# Altium footprint library Components.PcbLib: 6 footprints
Each footprint in its own frame and in the unit in brackets; x right, y up, seen from the top. Pads: shape width x height; smd on the part's side, far side on the other; paste and mask are expansions set on the pad; w line width, h text height; cw(c..) or ccw(c..) is an arc to the next point about the centre after c.
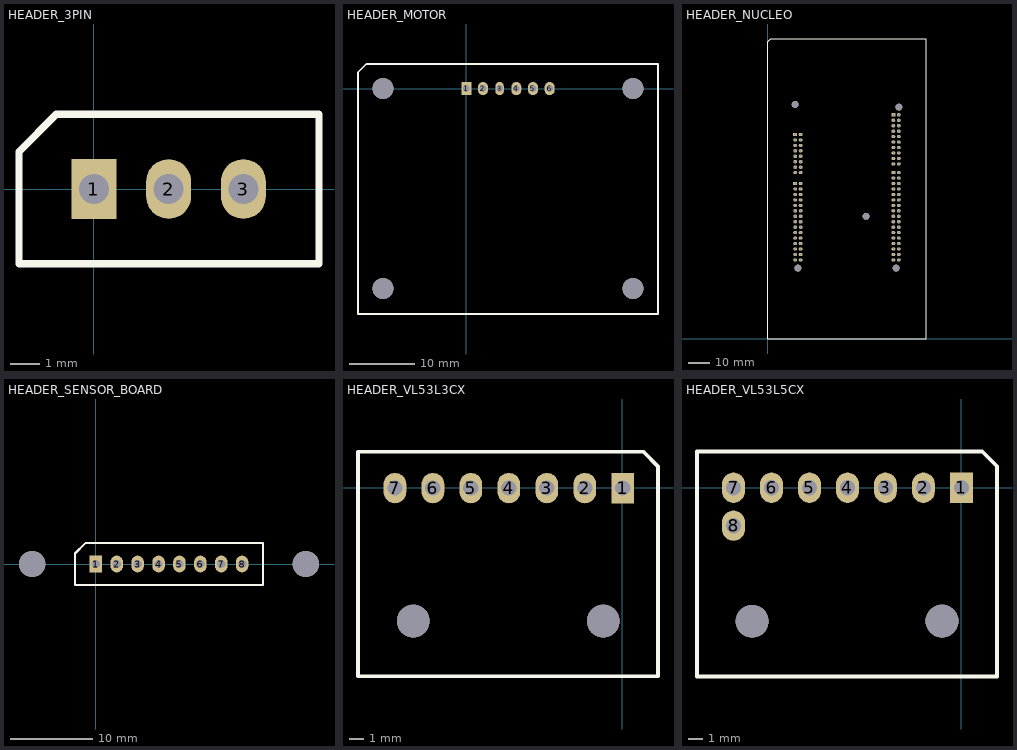
[diagram p0: the footprints below, top view; thin cyan lines are the x and y axes]

## HEADER_3PIN [mil]
pads (3):
  rect 60x80 hole 40.16: 1(0,0)
  oval 60x80 hole 40.16: 2(100,0) 3(200,0)
Top Overlay:
  lines w10: -100,-100 -100,50 -50,100 301,100 301,-100 -100,-100

## HEADER_MOTOR [mm]
pads (10):
  rect 1.524x2.032 hole 1.02: 1(0,0)
  oval 1.524x2.032 hole 1.02: 2(2.54,0) 4(7.62,0) 5(10.16,0) 6(12.7,0)
  oval 1.27x2.032 hole 1.02: 3(5.08,0)
  round 3.2 hole 3.2: ""(-12.7,-30.48) ""(-12.7,0) ""(25.4,-30.48) ""(25.4,0)
Top Overlay:
  lines w0.254: -16.502,-34.357 -16.502,2.473 -15.232,3.743 29.218,3.743 29.218,-34.357 -16.502,-34.357
3D body "MAKER-DRIVE.STEP": height 16.93, standoff 3.43, extent -15.232,-33.087 27.948,2.473
3D body: height 8.64, standoff 0, extent 11.411,-1.255 13.951,1.285
3D body: height 8.64, standoff 0, extent 8.871,-1.255 11.411,1.285
3D body: height 8.64, standoff 0, extent 6.331,-1.255 8.871,1.285
3D body: height 8.64, standoff 0, extent 3.791,-1.255 6.331,1.285
3D body: height 8.64, standoff 0, extent 1.251,-1.255 3.791,1.285
3D body: height 8.64, standoff 0, extent -1.289,-1.255 1.251,1.285

## HEADER_NUCLEO [mm] "Header for nucleo board"
pads (105):
  rect 1.8x1.5 hole 1.02: 1(12.7,95.25) 17(12.7,72.39) 47(58.42,104.394) 67(58.42,77.47)
  oval 1.8x1.5 hole 1.02: 2(15.24,95.25) 3(12.7,92.71) 4(15.24,92.71) 5(12.7,90.17) 6(15.24,90.17) 7(12.7,87.63) 8(15.24,87.63) 9(12.7,85.09) 10(15.24,85.09) 11(12.7,82.55) 12(15.24,82.55) 13(12.7,80.01) 14(15.24,80.01) 15(12.7,77.47) 16(15.24,77.47) 18(15.24,72.39) 19(12.7,69.85) 20(15.24,69.85) 21(12.7,67.31) 22(15.24,67.31) 23(12.7,64.77) 24(15.24,64.77) 25(12.7,62.23) 26(15.24,62.23) 27(12.7,59.69) 28(15.24,59.69) 29(12.7,57.15) 30(15.24,57.15) 31(12.7,54.61) 32(15.24,54.61) 33(12.7,52.07) 34(15.24,52.07) 35(12.7,49.53) 36(15.24,49.53) 37(12.7,46.99) 38(15.24,46.99) 39(12.7,44.45) 40(15.24,44.45) 41(12.7,41.91) 42(15.24,41.91) 43(12.7,39.37) 44(15.24,39.37) 45(12.7,36.83) 46(15.24,36.83) 48(60.96,104.394) 49(58.42,101.854) 50(60.96,101.854) 51(58.42,99.314) 52(60.96,99.314) 53(58.42,96.774) 54(60.96,96.774) 55(58.42,94.234) 56(60.96,94.234) 57(58.42,91.694) 58(60.96,91.694) 59(58.42,89.154) 60(60.96,89.154) 61(58.42,86.614) 62(60.96,86.614) 63(58.42,84.074) 64(60.96,84.074) 65(58.42,81.534) 66(60.96,81.534) 68(60.96,77.47) 69(58.42,74.93) 70(60.96,74.93) 71(58.42,72.39) 72(60.96,72.39) 73(58.42,69.85) 74(60.96,69.85) 75(58.42,67.31) 76(60.96,67.31) 77(58.42,64.77) 78(60.96,64.77) 79(58.42,62.23) 80(60.96,62.23) 81(58.42,59.69) 82(60.96,59.69) 83(58.42,57.15) 84(60.96,57.15) 85(58.42,54.61) 86(60.96,54.61) 87(58.42,52.07) 88(60.96,52.07) 89(58.42,49.53) 90(58.42,46.99) 90(60.96,49.53) 92(60.96,46.99) 93(58.42,44.45) 94(60.96,44.45) 95(58.42,41.91) 96(60.96,41.91) 97(58.42,39.37) 98(60.96,39.37) 99(58.42,36.83) 100(60.96,36.83)
  round 3.2 hole 3.2 unplated: ""(12.7,109.22) ""(13.97,33.02) ""(45.72,57.15) ""(59.69,33.02) ""(60.96,107.95)
Top Overlay:
  lines w0.254: 0,0 0,138.43 1.27,139.7 73.66,139.7 73.66,1.27 73.66,0 0,0
3D body: height 8.64, standoff 0, extent 57.15,40.638 59.69,43.178
3D body: height 2.54, standoff -10, extent 58.071,41.561 58.769,42.259
3D body: height 8.64, standoff 0, extent 59.69,40.638 62.23,43.178
3D body: height 2.54, standoff -10, extent 60.611,41.561 61.309,42.259
3D body: height 2.54, standoff -10, extent 60.611,51.721 61.309,52.419
3D body: height 8.64, standoff 0, extent 59.69,50.798 62.23,53.338
3D body: height 2.54, standoff -10, extent 58.071,51.721 58.769,52.419
3D body: height 8.64, standoff 0, extent 57.15,50.798 59.69,53.338
3D body: height 8.64, standoff 0, extent 57.15,45.718 59.69,48.258
3D body: height 2.54, standoff -10, extent 58.071,46.641 58.769,47.339
3D body: height 8.64, standoff 0, extent 59.69,45.718 62.23,48.258
3D body: height 2.54, standoff -10, extent 60.611,46.641 61.309,47.339
3D body: height 8.64, standoff 0, extent 59.69,48.258 62.23,50.798
3D body: height 2.54, standoff -10, extent 60.611,49.181 61.309,49.879
3D body: height 8.64, standoff 0, extent 57.15,48.258 59.69,50.798
3D body: height 2.54, standoff -10, extent 58.071,49.181 58.769,49.879
3D body: height 2.54, standoff -10, extent 60.611,44.101 61.309,44.799
3D body: height 8.64, standoff 0, extent 59.69,43.178 62.23,45.718
3D body: height 2.54, standoff -10, extent 58.071,44.101 58.769,44.799
3D body: height 8.64, standoff 0, extent 57.15,43.178 59.69,45.718
3D body: height 8.64, standoff 0, extent 57.15,55.878 59.69,58.418
3D body: height 2.54, standoff -10, extent 58.071,56.801 58.769,57.499
3D body: height 8.64, standoff 0, extent 59.69,55.878 62.23,58.418
3D body: height 2.54, standoff -10, extent 60.611,56.801 61.309,57.499
3D body: height 2.54, standoff -10, extent 58.071,61.881 58.769,62.579
3D body: height 8.64, standoff 0, extent 57.15,60.958 59.69,63.498
3D body: height 2.54, standoff -10, extent 60.611,61.881 61.309,62.579
3D body: height 8.64, standoff 0, extent 59.69,60.958 62.23,63.498
3D body: height 2.54, standoff -10, extent 60.611,59.341 61.309,60.039
3D body: height 8.64, standoff 0, extent 59.69,58.418 62.23,60.958
3D body: height 2.54, standoff -10, extent 58.071,59.341 58.769,60.039
3D body: height 8.64, standoff 0, extent 57.15,58.418 59.69,60.958
3D body: height 8.64, standoff 0, extent 57.15,63.498 59.69,66.038
3D body: height 2.54, standoff -10, extent 58.071,64.421 58.769,65.119
3D body: height 8.64, standoff 0, extent 59.69,63.498 62.23,66.038
3D body: height 2.54, standoff -10, extent 60.611,64.421 61.309,65.119
3D body: height 8.64, standoff 0, extent 59.69,66.038 62.23,68.578
3D body: height 2.54, standoff -10, extent 60.611,66.961 61.309,67.659
3D body: height 8.64, standoff 0, extent 57.15,66.038 59.69,68.578
3D body: height 2.54, standoff -10, extent 58.071,66.961 58.769,67.659
3D body: height 8.64, standoff 0, extent 57.15,68.578 59.69,71.118
3D body: height 2.54, standoff -10, extent 58.071,69.501 58.769,70.199
3D body: height 8.64, standoff 0, extent 59.69,68.578 62.23,71.118
3D body: height 2.54, standoff -10, extent 60.611,69.501 61.309,70.199
3D body: height 8.64, standoff 0, extent 57.15,71.118 59.69,73.658
3D body: height 2.54, standoff -10, extent 58.071,72.041 58.769,72.739
3D body: height 8.64, standoff 0, extent 59.69,71.118 62.23,73.658
3D body: height 2.54, standoff -10, extent 60.611,72.041 61.309,72.739
3D body: height 8.64, standoff 0, extent 57.15,73.658 59.69,76.198
3D body: height 2.54, standoff -10, extent 58.071,74.581 58.769,75.279
3D body: height 8.64, standoff 0, extent 59.69,73.658 62.23,76.198
3D body: height 2.54, standoff -10, extent 60.611,74.581 61.309,75.279
3D body: height 8.64, standoff 0, extent 59.69,76.198 62.23,78.738
3D body: height 2.54, standoff -10, extent 60.611,77.121 61.309,77.819
3D body: height 8.64, standoff 0, extent 57.15,76.198 59.69,78.738
3D body: height 2.54, standoff -10, extent 58.071,77.121 58.769,77.819
3D body: height 2.54, standoff -10, extent 60.611,54.261 61.309,54.959
3D body: height 8.64, standoff 0, extent 59.69,53.338 62.23,55.878
3D body: height 2.54, standoff -10, extent 58.071,54.261 58.769,54.959
3D body: height 8.64, standoff 0, extent 57.15,53.338 59.69,55.878
3D body: height 8.64, standoff 0, extent 57.15,38.098 59.69,40.638
3D body: height 2.54, standoff -10, extent 58.071,39.021 58.769,39.719
3D body: height 8.64, standoff 0, extent 59.69,38.098 62.23,40.638
3D body: height 2.54, standoff -10, extent 60.611,39.021 61.309,39.719
3D body: height 2.54, standoff -10, extent 60.611,36.481 61.309,37.179
3D body: height 8.64, standoff 0, extent 59.69,35.558 62.23,38.098
3D body: height 2.54, standoff -10, extent 58.071,36.481 58.769,37.179
3D body: height 8.64, standoff 0, extent 57.15,35.558 59.69,38.098
3D body: height 8.64, standoff 0, extent 57.15,80.262 59.69,82.802
3D body: height 2.54, standoff -10, extent 58.071,81.185 58.769,81.883
3D body: height 8.64, standoff 0, extent 59.69,80.262 62.23,82.802
3D body: height 2.54, standoff -10, extent 60.611,81.185 61.309,81.883
3D body: height 2.54, standoff -10, extent 58.071,104.045 58.769,104.743
3D body: height 8.64, standoff 0, extent 57.15,103.122 59.69,105.662
3D body: height 2.54, standoff -10, extent 60.611,104.045 61.309,104.743
3D body: height 8.64, standoff 0, extent 59.69,103.122 62.23,105.662
3D body: height 2.54, standoff -10, extent 60.611,101.505 61.309,102.203
3D body: height 8.64, standoff 0, extent 59.69,100.582 62.23,103.122
3D body: height 2.54, standoff -10, extent 58.071,101.505 58.769,102.203
3D body: height 8.64, standoff 0, extent 57.15,100.582 59.69,103.122
3D body: height 2.54, standoff -10, extent 60.611,98.965 61.309,99.663
3D body: height 8.64, standoff 0, extent 59.69,98.042 62.23,100.582
3D body: height 2.54, standoff -10, extent 58.071,98.965 58.769,99.663
3D body: height 8.64, standoff 0, extent 57.15,98.042 59.69,100.582
3D body: height 2.54, standoff -10, extent 60.611,96.425 61.309,97.123
3D body: height 8.64, standoff 0, extent 59.69,95.502 62.23,98.042
3D body: height 2.54, standoff -10, extent 58.071,96.425 58.769,97.123
3D body: height 8.64, standoff 0, extent 57.15,95.502 59.69,98.042
3D body: height 2.54, standoff -10, extent 58.071,93.885 58.769,94.583
3D body: height 8.64, standoff 0, extent 57.15,92.962 59.69,95.502
3D body: height 2.54, standoff -10, extent 60.611,93.885 61.309,94.583
3D body: height 8.64, standoff 0, extent 59.69,92.962 62.23,95.502
3D body: height 2.54, standoff -10, extent 60.611,91.345 61.309,92.043
3D body: height 8.64, standoff 0, extent 59.69,90.422 62.23,92.962
3D body: height 2.54, standoff -10, extent 58.071,91.345 58.769,92.043
3D body: height 8.64, standoff 0, extent 57.15,90.422 59.69,92.962
3D body: height 8.64, standoff 0, extent 57.15,85.342 59.69,87.882
3D body: height 2.54, standoff -10, extent 58.071,86.265 58.769,86.963
3D body: height 8.64, standoff 0, extent 59.69,85.342 62.23,87.882
3D body: height 2.54, standoff -10, extent 60.611,86.265 61.309,86.963
3D body: height 8.64, standoff 0, extent 59.69,87.882 62.23,90.422
3D body: height 2.54, standoff -10, extent 60.611,88.805 61.309,89.503
3D body: height 8.64, standoff 0, extent 57.15,87.882 59.69,90.422
3D body: height 2.54, standoff -10, extent 58.071,88.805 58.769,89.503
3D body: height 2.54, standoff -10, extent 60.611,83.725 61.309,84.423
3D body: height 8.64, standoff 0, extent 59.69,82.802 62.23,85.342
3D body: height 2.54, standoff -10, extent 58.071,83.725 58.769,84.423
3D body: height 8.64, standoff 0, extent 57.15,82.802 59.69,85.342
3D body: height 8.64, standoff 0, extent 11.43,35.558 13.97,38.098
3D body: height 2.54, standoff -10, extent 12.351,36.481 13.049,37.179
3D body: height 8.64, standoff 0, extent 13.97,35.558 16.51,38.098
3D body: height 2.54, standoff -10, extent 14.891,36.481 15.589,37.179
3D body: height 2.54, standoff -10, extent 14.891,46.641 15.589,47.339
3D body: height 8.64, standoff 0, extent 13.97,45.718 16.51,48.258
3D body: height 2.54, standoff -10, extent 12.351,46.641 13.049,47.339
3D body: height 8.64, standoff 0, extent 11.43,45.718 13.97,48.258
3D body: height 8.64, standoff 0, extent 11.43,40.638 13.97,43.178
3D body: height 2.54, standoff -10, extent 12.351,41.561 13.049,42.259
3D body: height 8.64, standoff 0, extent 13.97,40.638 16.51,43.178
3D body: height 2.54, standoff -10, extent 14.891,41.561 15.589,42.259
3D body: height 8.64, standoff 0, extent 13.97,43.178 16.51,45.718
3D body: height 2.54, standoff -10, extent 14.891,44.101 15.589,44.799
3D body: height 8.64, standoff 0, extent 11.43,43.178 13.97,45.718
3D body: height 2.54, standoff -10, extent 12.351,44.101 13.049,44.799
3D body: height 2.54, standoff -10, extent 14.891,39.021 15.589,39.719
3D body: height 8.64, standoff 0, extent 13.97,38.098 16.51,40.638
3D body: height 2.54, standoff -10, extent 12.351,39.021 13.049,39.719
3D body: height 8.64, standoff 0, extent 11.43,38.098 13.97,40.638
3D body: height 8.64, standoff 0, extent 11.43,50.798 13.97,53.338
3D body: height 2.54, standoff -10, extent 12.351,51.721 13.049,52.419
3D body: height 8.64, standoff 0, extent 13.97,50.798 16.51,53.338
3D body: height 2.54, standoff -10, extent 14.891,51.721 15.589,52.419
3D body: height 2.54, standoff -10, extent 12.351,56.801 13.049,57.499
3D body: height 8.64, standoff 0, extent 11.43,55.878 13.97,58.418
3D body: height 2.54, standoff -10, extent 14.891,56.801 15.589,57.499
3D body: height 8.64, standoff 0, extent 13.97,55.878 16.51,58.418
3D body: height 2.54, standoff -10, extent 14.891,54.261 15.589,54.959
3D body: height 8.64, standoff 0, extent 13.97,53.338 16.51,55.878
3D body: height 2.54, standoff -10, extent 12.351,54.261 13.049,54.959
3D body: height 8.64, standoff 0, extent 11.43,53.338 13.97,55.878
3D body: height 8.64, standoff 0, extent 11.43,58.418 13.97,60.958
3D body: height 2.54, standoff -10, extent 12.351,59.341 13.049,60.039
3D body: height 8.64, standoff 0, extent 13.97,58.418 16.51,60.958
3D body: height 2.54, standoff -10, extent 14.891,59.341 15.589,60.039
3D body: height 8.64, standoff 0, extent 13.97,60.958 16.51,63.498
3D body: height 2.54, standoff -10, extent 14.891,61.881 15.589,62.579
3D body: height 8.64, standoff 0, extent 11.43,60.958 13.97,63.498
3D body: height 2.54, standoff -10, extent 12.351,61.881 13.049,62.579
3D body: height 8.64, standoff 0, extent 11.43,63.498 13.97,66.038
3D body: height 2.54, standoff -10, extent 12.351,64.421 13.049,65.119
3D body: height 8.64, standoff 0, extent 13.97,63.498 16.51,66.038
3D body: height 2.54, standoff -10, extent 14.891,64.421 15.589,65.119
3D body: height 8.64, standoff 0, extent 11.43,66.038 13.97,68.578
3D body: height 2.54, standoff -10, extent 12.351,66.961 13.049,67.659
3D body: height 8.64, standoff 0, extent 13.97,66.038 16.51,68.578
3D body: height 2.54, standoff -10, extent 14.891,66.961 15.589,67.659
3D body: height 8.64, standoff 0, extent 11.43,68.578 13.97,71.118
3D body: height 2.54, standoff -10, extent 12.351,69.501 13.049,70.199
3D body: height 8.64, standoff 0, extent 13.97,68.578 16.51,71.118
3D body: height 2.54, standoff -10, extent 14.891,69.501 15.589,70.199
3D body: height 8.64, standoff 0, extent 13.97,71.118 16.51,73.658
3D body: height 2.54, standoff -10, extent 14.891,72.041 15.589,72.739
3D body: height 8.64, standoff 0, extent 11.43,71.118 13.97,73.658
3D body: height 2.54, standoff -10, extent 12.351,72.041 13.049,72.739
3D body: height 2.54, standoff -10, extent 14.891,49.181 15.589,49.879
3D body: height 8.64, standoff 0, extent 13.97,48.258 16.51,50.798
3D body: height 2.54, standoff -10, extent 12.351,49.181 13.049,49.879
3D body: height 8.64, standoff 0, extent 11.43,48.258 13.97,50.798
3D body: height 2.54, standoff -10, extent 12.351,94.901 13.049,95.599
3D body: height 8.64, standoff 0, extent 11.43,93.978 13.97,96.518
3D body: height 2.54, standoff -10, extent 14.891,94.901 15.589,95.599
3D body: height 8.64, standoff 0, extent 13.97,93.978 16.51,96.518
3D body: height 2.54, standoff -10, extent 14.891,92.361 15.589,93.059
3D body: height 8.64, standoff 0, extent 13.97,91.438 16.51,93.978
3D body: height 2.54, standoff -10, extent 12.351,92.361 13.049,93.059
3D body: height 8.64, standoff 0, extent 11.43,91.438 13.97,93.978
3D body: height 2.54, standoff -10, extent 14.891,89.821 15.589,90.519
3D body: height 8.64, standoff 0, extent 13.97,88.898 16.51,91.438
3D body: height 2.54, standoff -10, extent 12.351,89.821 13.049,90.519
3D body: height 8.64, standoff 0, extent 11.43,88.898 13.97,91.438
3D body: height 2.54, standoff -10, extent 14.891,87.281 15.589,87.979
3D body: height 8.64, standoff 0, extent 13.97,86.358 16.51,88.898
3D body: height 2.54, standoff -10, extent 12.351,87.281 13.049,87.979
3D body: height 8.64, standoff 0, extent 11.43,86.358 13.97,88.898
3D body: height 2.54, standoff -10, extent 12.351,84.741 13.049,85.439
3D body: height 8.64, standoff 0, extent 11.43,83.818 13.97,86.358
3D body: height 2.54, standoff -10, extent 14.891,84.741 15.589,85.439
3D body: height 8.64, standoff 0, extent 13.97,83.818 16.51,86.358
3D body: height 2.54, standoff -10, extent 14.891,82.201 15.589,82.899
3D body: height 8.64, standoff 0, extent 13.97,81.278 16.51,83.818
3D body: height 2.54, standoff -10, extent 12.351,82.201 13.049,82.899
3D body: height 8.64, standoff 0, extent 11.43,81.278 13.97,83.818
3D body: height 8.64, standoff 0, extent 11.43,76.198 13.97,78.738
3D body: height 2.54, standoff -10, extent 12.351,77.121 13.049,77.819
3D body: height 2.54, standoff -10, extent 14.891,77.121 15.589,77.819
3D body: height 8.64, standoff 0, extent 13.97,78.738 16.51,81.278
3D body: height 2.54, standoff -10, extent 14.891,79.661 15.589,80.359
3D body: height 8.64, standoff 0, extent 11.43,78.738 13.97,81.278
3D body: height 2.54, standoff -10, extent 12.351,79.661 13.049,80.359
3D body: height 8.64, standoff 0, extent 13.97,76.198 16.51,78.738
3D body "NUCLEO-F767ZI.step": height 22.28, standoff 1.46, extent 1.856,1.227 71.856,138.217

## HEADER_SENSOR_BOARD [mil]
pads (10):
  rect 60x80 hole 40.16: 1(0,0)
  oval 60x80 hole 40.16: 2(100,0) 3(200,0) 4(300,0) 5(400,0) 6(500,0) 7(600,0) 8(700,0)
  round 125.98 hole 125.98: ""(-304.72,0) ""(1004.72,0)
Top Overlay:
  lines w10: -100,-100 800,-100 800,100 -50,100 -100,50 -100,-100

## HEADER_VL53L3CX [mm]
pads (9):
  rect 1.524x2.032 hole 1.02: 1(0.019,-0.015)
  oval 1.524x2.032 hole 1.02: 2(-2.521,-0.015) 3(-5.061,-0.015) 4(-7.601,-0.015) 5(-10.141,-0.015) 6(-12.681,-0.015) 7(-15.221,-0.015)
  round 2.2 hole 2.2: ""(-13.994,-8.911) ""(-1.286,-8.914)
Top Overlay:
  lines w0.254: -17.689,2.398 -17.689,-12.603 2.377,-12.603 2.377,1.437 1.397,2.416 -17.689,2.416
3D body: height 8.64, standoff 0, extent -16.51,-1.27 -13.97,1.27
3D body: height 8.64, standoff 0, extent -13.97,-1.27 -11.43,1.27
3D body: height 8.64, standoff 0, extent -11.43,-1.27 -8.89,1.27
3D body: height 8.64, standoff 0, extent -8.89,-1.27 -6.35,1.27
3D body: height 8.64, standoff 0, extent -6.35,-1.27 -3.81,1.27
3D body: height 8.64, standoff 0, extent -3.81,-1.27 -1.27,1.27
3D body: height 8.64, standoff 0, extent -1.27,-1.27 1.27,1.27
3D body "vl53l0x-vl53l1x-vl53l3cx-vl53l4cd-carrier-model.step": height 10.85, standoff 8.64, extent -16.531,-11.455 1.249,1.245

## HEADER_VL53L5CX [mil]
pads (10):
  rect 60x80 hole 40.16: 1(-0.03,-0.06)
  oval 60x80 hole 40.16: 2(-100.03,-0.06) 3(-200.03,-0.06) 4(-300.03,-0.06) 5(-400.03,-0.06) 6(-500.03,-0.06) 7(-600.03,-0.06) 8(-600.03,-100.06)
  round 86.61 hole 86.61: ""(-550.97,-351.75) ""(-50.99,-351.39)
Top Overlay:
  lines w10: -696.24,-497.06 93.76,-497.06 93.76,56.15 54.97,94.94 -696.24,94.94 -696.24,-497.06
3D body: height 340, standoff 0, extent -650.07,-149.85 -550.07,-49.85
3D body: height 340, standoff 0, extent -650.07,-49.85 -550.07,50.15
3D body: height 340, standoff 0, extent -550.07,-49.85 -450.07,50.15
3D body: height 340, standoff 0, extent -450.07,-49.85 -350.07,50.15
3D body: height 340, standoff 0, extent -350.07,-49.85 -250.07,50.15
3D body: height 340, standoff 0, extent -250.07,-49.85 -150.07,50.15
3D body: height 340, standoff 0, extent -150.02,-49.84 -50.02,50.16
3D body: height 340, standoff 0, extent -50,-50 50,50
3D body "vl53l5cx-carrier-model.step": height 441.02, standoff 340, extent -651.03,-451.58 48.97,48.42